# Altium schematic symbol library Connector.SchLib: 394 symbols (part 4 of 4)
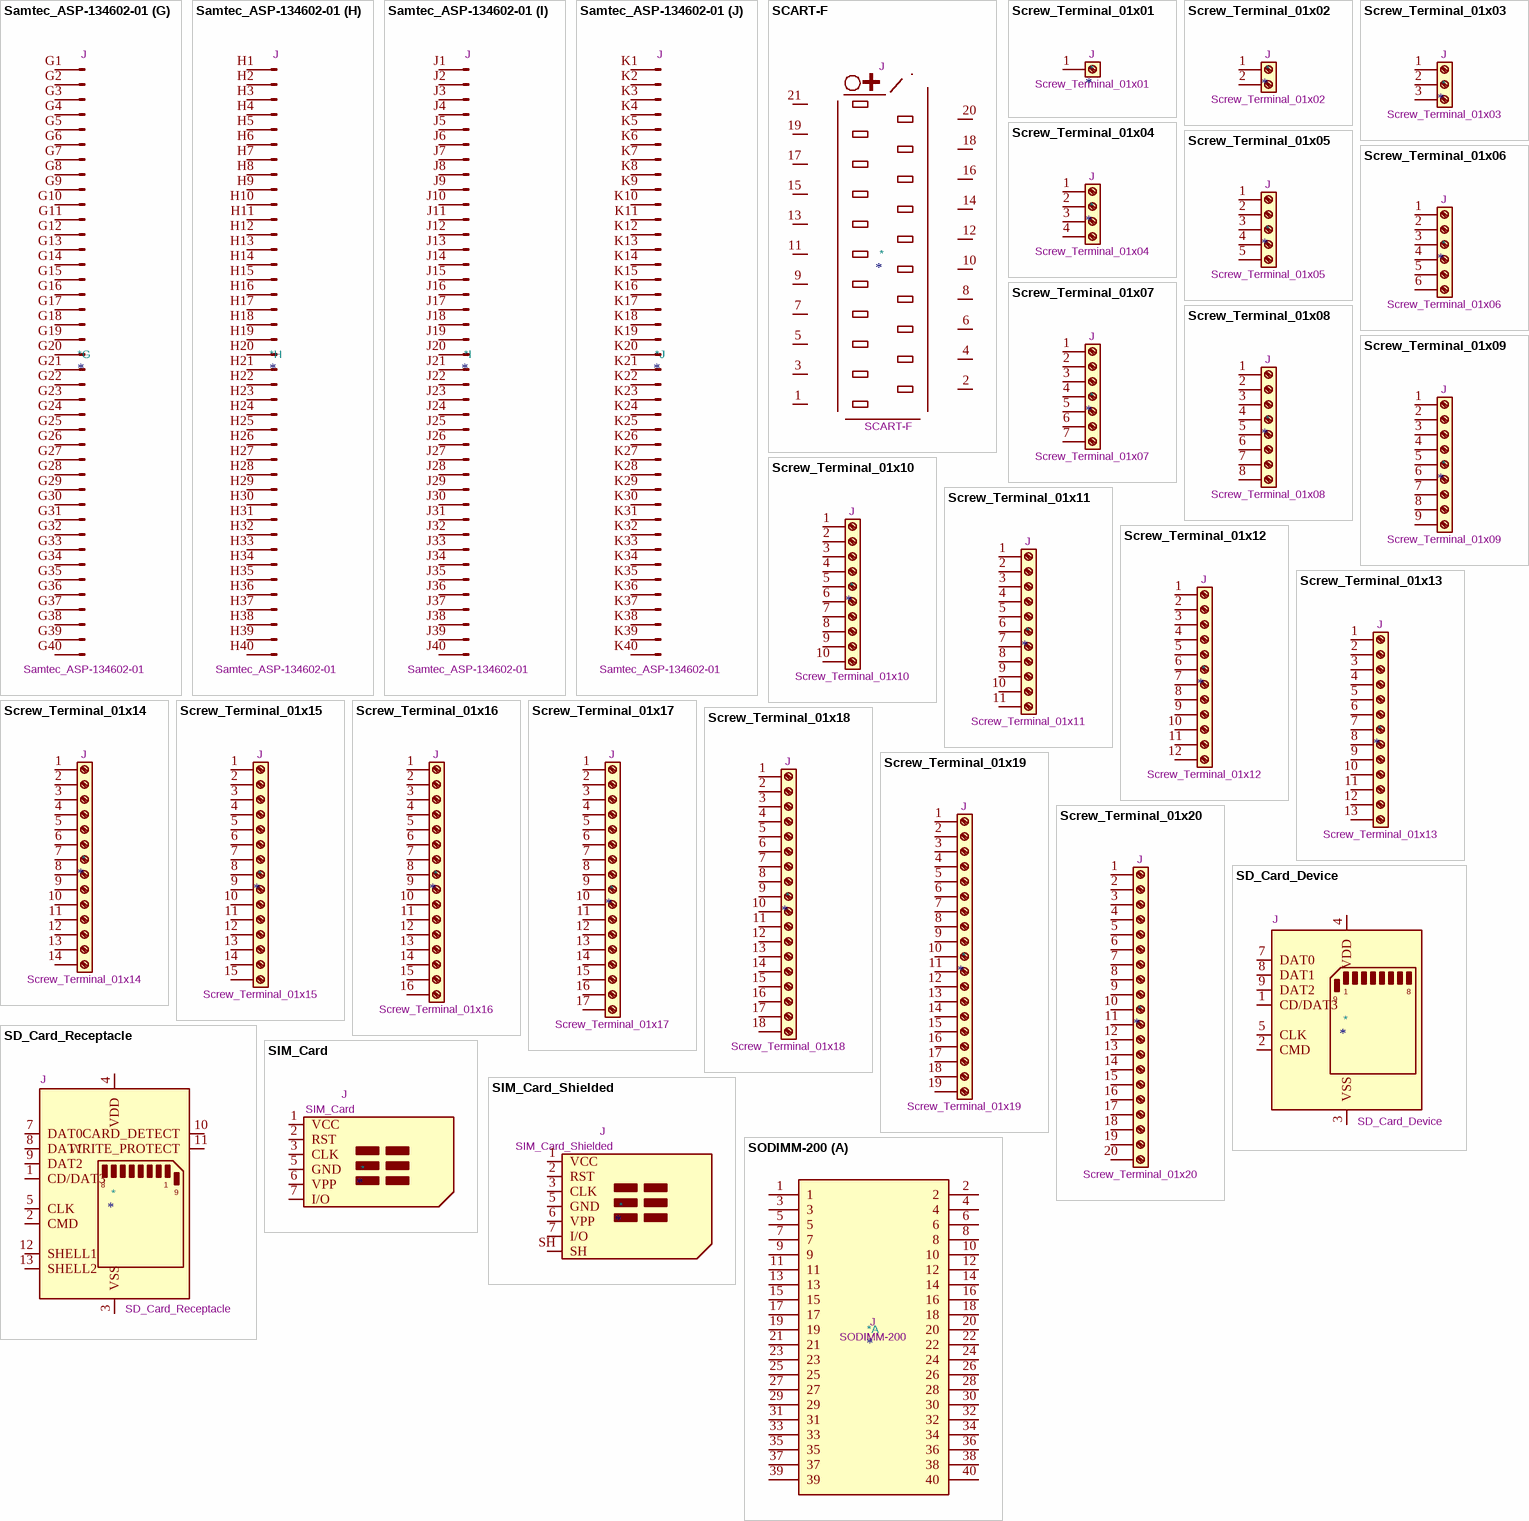
[diagram p20: symbols Samtec_ASP-134602-01 to SODIMM-200]

## Samtec_ASP-134602-01
designator *  value Samtec_ASP-134602-01  Reference: J
Connector array, 10x40, 1.27mm pitch, mezzanine-card, plug, gold finish, VITA 57.1 FMC, SMD; ki_keywords: FPGA Mezzanine Card FMC Terminal Connector Header; ki_fp_filters: *FMC*ASP*134602?01*10x40*P1.27mm* *FMC*ASP*134486?01*10x40*P1.27mm*; Datasheet: http://suddendocs.samtec.com/prints/asp-134602-01-mkt.pdf; Description_: Connector array, 10x40, 1.27mm pitch, mezzanine-card, plug, gold finish, VITA 57.1 FMC, SMD
part A pins: A1 Pin_1, A2 Pin_2, A3 Pin_3, A4 Pin_4, A5 Pin_5, A6 Pin_6, A7 Pin_7, A8 Pin_8, A9 Pin_9, A10 Pin_10, A11 Pin_11, A12 Pin_12, A13 Pin_13, A14 Pin_14, A15 Pin_15, A16 Pin_16, A17 Pin_17, A18 Pin_18, A19 Pin_19, A20 Pin_20, A21 Pin_21, A22 Pin_22, A23 Pin_23, A24 Pin_24, A25 Pin_25, A26 Pin_26, A27 Pin_27, A28 Pin_28, A29 Pin_29, A30 Pin_30, A31 Pin_31, A32 Pin_32, A33 Pin_33, A34 Pin_34, A35 Pin_35, A36 Pin_36, A37 Pin_37, A38 Pin_38, A39 Pin_39, A40 Pin_40
part B pins: B1 Pin_1, B2 Pin_2, B3 Pin_3, B4 Pin_4, B5 Pin_5, B6 Pin_6, B7 Pin_7, B8 Pin_8, B9 Pin_9, B10 Pin_10, B11 Pin_11, B12 Pin_12, B13 Pin_13, B14 Pin_14, B15 Pin_15, B16 Pin_16, B17 Pin_17, B18 Pin_18, B19 Pin_19, B20 Pin_20, B21 Pin_21, B22 Pin_22, B23 Pin_23, B24 Pin_24, B25 Pin_25, B26 Pin_26, B27 Pin_27, B28 Pin_28, B29 Pin_29, B30 Pin_30, B31 Pin_31, B32 Pin_32, B33 Pin_33, B34 Pin_34, B35 Pin_35, B36 Pin_36, B37 Pin_37, B38 Pin_38, B39 Pin_39, B40 Pin_40
part C pins: C1 Pin_1, C2 Pin_2, C3 Pin_3, C4 Pin_4, C5 Pin_5, C6 Pin_6, C7 Pin_7, C8 Pin_8, C9 Pin_9, C10 Pin_10, C11 Pin_11, C12 Pin_12, C13 Pin_13, C14 Pin_14, C15 Pin_15, C16 Pin_16, C17 Pin_17, C18 Pin_18, C19 Pin_19, C20 Pin_20, C21 Pin_21, C22 Pin_22, C23 Pin_23, C24 Pin_24, C25 Pin_25, C26 Pin_26, C27 Pin_27, C28 Pin_28, C29 Pin_29, C30 Pin_30, C31 Pin_31, C32 Pin_32, C33 Pin_33, C34 Pin_34, C35 Pin_35, C36 Pin_36, C37 Pin_37, C38 Pin_38, C39 Pin_39, C40 Pin_40
part D pins: D1 Pin_1, D2 Pin_2, D3 Pin_3, D4 Pin_4, D5 Pin_5, D6 Pin_6, D7 Pin_7, D8 Pin_8, D9 Pin_9, D10 Pin_10, D11 Pin_11, D12 Pin_12, D13 Pin_13, D14 Pin_14, D15 Pin_15, D16 Pin_16, D17 Pin_17, D18 Pin_18, D19 Pin_19, D20 Pin_20, D21 Pin_21, D22 Pin_22, D23 Pin_23, D24 Pin_24, D25 Pin_25, D26 Pin_26, D27 Pin_27, D28 Pin_28, D29 Pin_29, D30 Pin_30, D31 Pin_31, D32 Pin_32, D33 Pin_33, D34 Pin_34, D35 Pin_35, D36 Pin_36, D37 Pin_37, D38 Pin_38, D39 Pin_39, D40 Pin_40
part E pins: E1 Pin_1, E2 Pin_2, E3 Pin_3, E4 Pin_4, E5 Pin_5, E6 Pin_6, E7 Pin_7, E8 Pin_8, E9 Pin_9, E10 Pin_10, E11 Pin_11, E12 Pin_12, E13 Pin_13, E14 Pin_14, E15 Pin_15, E16 Pin_16, E17 Pin_17, E18 Pin_18, E19 Pin_19, E20 Pin_20, E21 Pin_21, E22 Pin_22, E23 Pin_23, E24 Pin_24, E25 Pin_25, E26 Pin_26, E27 Pin_27, E28 Pin_28, E29 Pin_29, E30 Pin_30, E31 Pin_31, E32 Pin_32, E33 Pin_33, E34 Pin_34, E35 Pin_35, E36 Pin_36, E37 Pin_37, E38 Pin_38, E39 Pin_39, E40 Pin_40
part F pins: F1 Pin_1, F2 Pin_2, F3 Pin_3, F4 Pin_4, F5 Pin_5, F6 Pin_6, F7 Pin_7, F8 Pin_8, F9 Pin_9, F10 Pin_10, F11 Pin_11, F12 Pin_12, F13 Pin_13, F14 Pin_14, F15 Pin_15, F16 Pin_16, F17 Pin_17, F18 Pin_18, F19 Pin_19, F20 Pin_20, F21 Pin_21, F22 Pin_22, F23 Pin_23, F24 Pin_24, F25 Pin_25, F26 Pin_26, F27 Pin_27, F28 Pin_28, F29 Pin_29, F30 Pin_30, F31 Pin_31, F32 Pin_32, F33 Pin_33, F34 Pin_34, F35 Pin_35, F36 Pin_36, F37 Pin_37, F38 Pin_38, F39 Pin_39, F40 Pin_40
part G pins: G1 Pin_1, G2 Pin_2, G3 Pin_3, G4 Pin_4, G5 Pin_5, G6 Pin_6, G7 Pin_7, G8 Pin_8, G9 Pin_9, G10 Pin_10, G11 Pin_11, G12 Pin_12, G13 Pin_13, G14 Pin_14, G15 Pin_15, G16 Pin_16, G17 Pin_17, G18 Pin_18, G19 Pin_19, G20 Pin_20, G21 Pin_21, G22 Pin_22, G23 Pin_23, G24 Pin_24, G25 Pin_25, G26 Pin_26, G27 Pin_27, G28 Pin_28, G29 Pin_29, G30 Pin_30, G31 Pin_31, G32 Pin_32, G33 Pin_33, G34 Pin_34, G35 Pin_35, G36 Pin_36, G37 Pin_37, G38 Pin_38, G39 Pin_39, G40 Pin_40
part H pins: H1 Pin_1, H2 Pin_2, H3 Pin_3, H4 Pin_4, H5 Pin_5, H6 Pin_6, H7 Pin_7, H8 Pin_8, H9 Pin_9, H10 Pin_10, H11 Pin_11, H12 Pin_12, H13 Pin_13, H14 Pin_14, H15 Pin_15, H16 Pin_16, H17 Pin_17, H18 Pin_18, H19 Pin_19, H20 Pin_20, H21 Pin_21, H22 Pin_22, H23 Pin_23, H24 Pin_24, H25 Pin_25, H26 Pin_26, H27 Pin_27, H28 Pin_28, H29 Pin_29, H30 Pin_30, H31 Pin_31, H32 Pin_32, H33 Pin_33, H34 Pin_34, H35 Pin_35, H36 Pin_36, H37 Pin_37, H38 Pin_38, H39 Pin_39, H40 Pin_40
part I pins: J1 Pin_1, J2 Pin_2, J3 Pin_3, J4 Pin_4, J5 Pin_5, J6 Pin_6, J7 Pin_7, J8 Pin_8, J9 Pin_9, J10 Pin_10, J11 Pin_11, J12 Pin_12, J13 Pin_13, J14 Pin_14, J15 Pin_15, J16 Pin_16, J17 Pin_17, J18 Pin_18, J19 Pin_19, J20 Pin_20, J21 Pin_21, J22 Pin_22, J23 Pin_23, J24 Pin_24, J25 Pin_25, J26 Pin_26, J27 Pin_27, J28 Pin_28, J29 Pin_29, J30 Pin_30, J31 Pin_31, J32 Pin_32, J33 Pin_33, J34 Pin_34, J35 Pin_35, J36 Pin_36, J37 Pin_37, J38 Pin_38, J39 Pin_39, J40 Pin_40
part J pins: K1 Pin_1, K2 Pin_2, K3 Pin_3, K4 Pin_4, K5 Pin_5, K6 Pin_6, K7 Pin_7, K8 Pin_8, K9 Pin_9, K10 Pin_10, K11 Pin_11, K12 Pin_12, K13 Pin_13, K14 Pin_14, K15 Pin_15, K16 Pin_16, K17 Pin_17, K18 Pin_18, K19 Pin_19, K20 Pin_20, K21 Pin_21, K22 Pin_22, K23 Pin_23, K24 Pin_24, K25 Pin_25, K26 Pin_26, K27 Pin_27, K28 Pin_28, K29 Pin_29, K30 Pin_30, K31 Pin_31, K32 Pin_32, K33 Pin_33, K34 Pin_34, K35 Pin_35, K36 Pin_36, K37 Pin_37, K38 Pin_38, K39 Pin_39, K40 Pin_40

## SCART-F
designator *  value SCART-F  Reference: J
Prise Peritel; ki_keywords: connector; Datasheet: ~; Description_: Prise Peritel
pins: 1 P1, 2 P2, 3 P3, 4 P4, 5 P5, 6 P6, 7 P7, 8 P8, 9 P9, 10 P10, 11 P11, 12 P12, 13 P13, 14 P14, 15 P15, 16 P16, 17 P17, 18 P18, 19 P19, 20 P20, 21 P21
text: +

## Screw_Terminal_01x01
designator *  value Screw_Terminal_01x01  Reference: J
Generic screw terminal, single row, 01x01, script generated (kicad-library-utils/schlib/autogen/connector/); ki_fp_filters: TerminalBlock*:*; Datasheet: ~; Description_: Generic screw terminal, single row, 01x01, script generated (kicad-library-utils/schlib/autogen/connector/); ki_keywords: screw terminal
pins: 1 Pin_1

## Screw_Terminal_01x02
designator *  value Screw_Terminal_01x02  Reference: J
Generic screw terminal, single row, 01x02, script generated (kicad-library-utils/schlib/autogen/connector/); ki_fp_filters: TerminalBlock*:*; Datasheet: ~; Description_: Generic screw terminal, single row, 01x02, script generated (kicad-library-utils/schlib/autogen/connector/); ki_keywords: screw terminal
pins: 1 Pin_1, 2 Pin_2

## Screw_Terminal_01x03
designator *  value Screw_Terminal_01x03  Reference: J
Generic screw terminal, single row, 01x03, script generated (kicad-library-utils/schlib/autogen/connector/); ki_fp_filters: TerminalBlock*:*; Datasheet: ~; Description_: Generic screw terminal, single row, 01x03, script generated (kicad-library-utils/schlib/autogen/connector/); ki_keywords: screw terminal
pins: 1 Pin_1, 2 Pin_2, 3 Pin_3

## Screw_Terminal_01x04
designator *  value Screw_Terminal_01x04  Reference: J
Generic screw terminal, single row, 01x04, script generated (kicad-library-utils/schlib/autogen/connector/); ki_fp_filters: TerminalBlock*:*; Datasheet: ~; Description_: Generic screw terminal, single row, 01x04, script generated (kicad-library-utils/schlib/autogen/connector/); ki_keywords: screw terminal
pins: 1 Pin_1, 2 Pin_2, 3 Pin_3, 4 Pin_4

## Screw_Terminal_01x05
designator *  value Screw_Terminal_01x05  Reference: J
Generic screw terminal, single row, 01x05, script generated (kicad-library-utils/schlib/autogen/connector/); ki_fp_filters: TerminalBlock*:*; Datasheet: ~; Description_: Generic screw terminal, single row, 01x05, script generated (kicad-library-utils/schlib/autogen/connector/); ki_keywords: screw terminal
pins: 1 Pin_1, 2 Pin_2, 3 Pin_3, 4 Pin_4, 5 Pin_5

## Screw_Terminal_01x06
designator *  value Screw_Terminal_01x06  Reference: J
Generic screw terminal, single row, 01x06, script generated (kicad-library-utils/schlib/autogen/connector/); ki_fp_filters: TerminalBlock*:*; Datasheet: ~; Description_: Generic screw terminal, single row, 01x06, script generated (kicad-library-utils/schlib/autogen/connector/); ki_keywords: screw terminal
pins: 1 Pin_1, 2 Pin_2, 3 Pin_3, 4 Pin_4, 5 Pin_5, 6 Pin_6

## Screw_Terminal_01x07
designator *  value Screw_Terminal_01x07  Reference: J
Generic screw terminal, single row, 01x07, script generated (kicad-library-utils/schlib/autogen/connector/); ki_fp_filters: TerminalBlock*:*; Datasheet: ~; Description_: Generic screw terminal, single row, 01x07, script generated (kicad-library-utils/schlib/autogen/connector/); ki_keywords: screw terminal
pins: 1 Pin_1, 2 Pin_2, 3 Pin_3, 4 Pin_4, 5 Pin_5, 6 Pin_6, 7 Pin_7

## Screw_Terminal_01x08
designator *  value Screw_Terminal_01x08  Reference: J
Generic screw terminal, single row, 01x08, script generated (kicad-library-utils/schlib/autogen/connector/); ki_fp_filters: TerminalBlock*:*; Datasheet: ~; Description_: Generic screw terminal, single row, 01x08, script generated (kicad-library-utils/schlib/autogen/connector/); ki_keywords: screw terminal
pins: 1 Pin_1, 2 Pin_2, 3 Pin_3, 4 Pin_4, 5 Pin_5, 6 Pin_6, 7 Pin_7, 8 Pin_8

## Screw_Terminal_01x09
designator *  value Screw_Terminal_01x09  Reference: J
Generic screw terminal, single row, 01x09, script generated (kicad-library-utils/schlib/autogen/connector/); ki_fp_filters: TerminalBlock*:*; Datasheet: ~; Description_: Generic screw terminal, single row, 01x09, script generated (kicad-library-utils/schlib/autogen/connector/); ki_keywords: screw terminal
pins: 1 Pin_1, 2 Pin_2, 3 Pin_3, 4 Pin_4, 5 Pin_5, 6 Pin_6, 7 Pin_7, 8 Pin_8, 9 Pin_9

## Screw_Terminal_01x10
designator *  value Screw_Terminal_01x10  Reference: J
Generic screw terminal, single row, 01x10, script generated (kicad-library-utils/schlib/autogen/connector/); ki_fp_filters: TerminalBlock*:*; Datasheet: ~; Description_: Generic screw terminal, single row, 01x10, script generated (kicad-library-utils/schlib/autogen/connector/); ki_keywords: screw terminal
pins: 1 Pin_1, 2 Pin_2, 3 Pin_3, 4 Pin_4, 5 Pin_5, 6 Pin_6, 7 Pin_7, 8 Pin_8, 9 Pin_9, 10 Pin_10

## Screw_Terminal_01x11
designator *  value Screw_Terminal_01x11  Reference: J
Generic screw terminal, single row, 01x11, script generated (kicad-library-utils/schlib/autogen/connector/); ki_fp_filters: TerminalBlock*:*; Datasheet: ~; Description_: Generic screw terminal, single row, 01x11, script generated (kicad-library-utils/schlib/autogen/connector/); ki_keywords: screw terminal
pins: 1 Pin_1, 2 Pin_2, 3 Pin_3, 4 Pin_4, 5 Pin_5, 6 Pin_6, 7 Pin_7, 8 Pin_8, 9 Pin_9, 10 Pin_10, 11 Pin_11

## Screw_Terminal_01x12
designator *  value Screw_Terminal_01x12  Reference: J
Generic screw terminal, single row, 01x12, script generated (kicad-library-utils/schlib/autogen/connector/); ki_fp_filters: TerminalBlock*:*; Datasheet: ~; Description_: Generic screw terminal, single row, 01x12, script generated (kicad-library-utils/schlib/autogen/connector/); ki_keywords: screw terminal
pins: 1 Pin_1, 2 Pin_2, 3 Pin_3, 4 Pin_4, 5 Pin_5, 6 Pin_6, 7 Pin_7, 8 Pin_8, 9 Pin_9, 10 Pin_10, 11 Pin_11, 12 Pin_12

## Screw_Terminal_01x13
designator *  value Screw_Terminal_01x13  Reference: J
Generic screw terminal, single row, 01x13, script generated (kicad-library-utils/schlib/autogen/connector/); ki_fp_filters: TerminalBlock*:*; Datasheet: ~; Description_: Generic screw terminal, single row, 01x13, script generated (kicad-library-utils/schlib/autogen/connector/); ki_keywords: screw terminal
pins: 1 Pin_1, 2 Pin_2, 3 Pin_3, 4 Pin_4, 5 Pin_5, 6 Pin_6, 7 Pin_7, 8 Pin_8, 9 Pin_9, 10 Pin_10, 11 Pin_11, 12 Pin_12, 13 Pin_13

## Screw_Terminal_01x14
designator *  value Screw_Terminal_01x14  Reference: J
Generic screw terminal, single row, 01x14, script generated (kicad-library-utils/schlib/autogen/connector/); ki_fp_filters: TerminalBlock*:*; Datasheet: ~; Description_: Generic screw terminal, single row, 01x14, script generated (kicad-library-utils/schlib/autogen/connector/); ki_keywords: screw terminal
pins: 1 Pin_1, 2 Pin_2, 3 Pin_3, 4 Pin_4, 5 Pin_5, 6 Pin_6, 7 Pin_7, 8 Pin_8, 9 Pin_9, 10 Pin_10, 11 Pin_11, 12 Pin_12, 13 Pin_13, 14 Pin_14

## Screw_Terminal_01x15
designator *  value Screw_Terminal_01x15  Reference: J
Generic screw terminal, single row, 01x15, script generated (kicad-library-utils/schlib/autogen/connector/); ki_fp_filters: TerminalBlock*:*; Datasheet: ~; Description_: Generic screw terminal, single row, 01x15, script generated (kicad-library-utils/schlib/autogen/connector/); ki_keywords: screw terminal
pins: 1 Pin_1, 2 Pin_2, 3 Pin_3, 4 Pin_4, 5 Pin_5, 6 Pin_6, 7 Pin_7, 8 Pin_8, 9 Pin_9, 10 Pin_10, 11 Pin_11, 12 Pin_12, 13 Pin_13, 14 Pin_14, 15 Pin_15

## Screw_Terminal_01x16
designator *  value Screw_Terminal_01x16  Reference: J
Generic screw terminal, single row, 01x16, script generated (kicad-library-utils/schlib/autogen/connector/); ki_fp_filters: TerminalBlock*:*; Datasheet: ~; Description_: Generic screw terminal, single row, 01x16, script generated (kicad-library-utils/schlib/autogen/connector/); ki_keywords: screw terminal
pins: 1 Pin_1, 2 Pin_2, 3 Pin_3, 4 Pin_4, 5 Pin_5, 6 Pin_6, 7 Pin_7, 8 Pin_8, 9 Pin_9, 10 Pin_10, 11 Pin_11, 12 Pin_12, 13 Pin_13, 14 Pin_14, 15 Pin_15, 16 Pin_16

## Screw_Terminal_01x17
designator *  value Screw_Terminal_01x17  Reference: J
Generic screw terminal, single row, 01x17, script generated (kicad-library-utils/schlib/autogen/connector/); ki_fp_filters: TerminalBlock*:*; Datasheet: ~; Description_: Generic screw terminal, single row, 01x17, script generated (kicad-library-utils/schlib/autogen/connector/); ki_keywords: screw terminal
pins: 1 Pin_1, 2 Pin_2, 3 Pin_3, 4 Pin_4, 5 Pin_5, 6 Pin_6, 7 Pin_7, 8 Pin_8, 9 Pin_9, 10 Pin_10, 11 Pin_11, 12 Pin_12, 13 Pin_13, 14 Pin_14, 15 Pin_15, 16 Pin_16, 17 Pin_17

## Screw_Terminal_01x18
designator *  value Screw_Terminal_01x18  Reference: J
Generic screw terminal, single row, 01x18, script generated (kicad-library-utils/schlib/autogen/connector/); ki_fp_filters: TerminalBlock*:*; Datasheet: ~; Description_: Generic screw terminal, single row, 01x18, script generated (kicad-library-utils/schlib/autogen/connector/); ki_keywords: screw terminal
pins: 1 Pin_1, 2 Pin_2, 3 Pin_3, 4 Pin_4, 5 Pin_5, 6 Pin_6, 7 Pin_7, 8 Pin_8, 9 Pin_9, 10 Pin_10, 11 Pin_11, 12 Pin_12, 13 Pin_13, 14 Pin_14, 15 Pin_15, 16 Pin_16, 17 Pin_17, 18 Pin_18

## Screw_Terminal_01x19
designator *  value Screw_Terminal_01x19  Reference: J
Generic screw terminal, single row, 01x19, script generated (kicad-library-utils/schlib/autogen/connector/); ki_fp_filters: TerminalBlock*:*; Datasheet: ~; Description_: Generic screw terminal, single row, 01x19, script generated (kicad-library-utils/schlib/autogen/connector/); ki_keywords: screw terminal
pins: 1 Pin_1, 2 Pin_2, 3 Pin_3, 4 Pin_4, 5 Pin_5, 6 Pin_6, 7 Pin_7, 8 Pin_8, 9 Pin_9, 10 Pin_10, 11 Pin_11, 12 Pin_12, 13 Pin_13, 14 Pin_14, 15 Pin_15, 16 Pin_16, 17 Pin_17, 18 Pin_18, 19 Pin_19

## Screw_Terminal_01x20
designator *  value Screw_Terminal_01x20  Reference: J
Generic screw terminal, single row, 01x20, script generated (kicad-library-utils/schlib/autogen/connector/); ki_fp_filters: TerminalBlock*:*; Datasheet: ~; Description_: Generic screw terminal, single row, 01x20, script generated (kicad-library-utils/schlib/autogen/connector/); ki_keywords: screw terminal
pins: 1 Pin_1, 2 Pin_2, 3 Pin_3, 4 Pin_4, 5 Pin_5, 6 Pin_6, 7 Pin_7, 8 Pin_8, 9 Pin_9, 10 Pin_10, 11 Pin_11, 12 Pin_12, 13 Pin_13, 14 Pin_14, 15 Pin_15, 16 Pin_16, 17 Pin_17, 18 Pin_18, 19 Pin_19, 20 Pin_20

## SD_Card_Device
designator *  value SD_Card_Device  Reference: J
SD card device/card; ki_keywords: connector SD; ki_fp_filters: SD*Device*; Datasheet: http://www.convict.lu/pdf/ProdManualSDCardv1.9.pdf; Description_: SD card device/card
pins: 1 CD/DAT3, 2 CMD, 3 VSS, 4 VDD, 5 CLK, 6 VSS hidden, 7 DAT0, 8 DAT1, 9 DAT2

## SD_Card_Receptacle
designator *  value SD_Card_Receptacle  Reference: J
SD card receptacle; ki_keywords: connector SD; ki_fp_filters: SD*; Datasheet: http://portal.fciconnect.com/Comergent//fci/drawing/10067847.pdf; Description_: SD card receptacle
pins: 1 CD/DAT3, 2 CMD, 3 VSS, 4 VDD, 5 CLK, 6 VSS hidden, 7 DAT0, 8 DAT1, 9 DAT2, 10 CARD_DETECT, 11 WRITE_PROTECT, 12 SHELL1, 13 SHELL2

## SIM_Card
designator *  value SIM_Card  Reference: J
SIM Card; ki_keywords: SIM card UICC; ki_fp_filters: *SIM*Card*Holder*; Datasheet: ~; Description_: SIM Card
pins: 1 VCC, 2 RST, 3 CLK, 5 GND, 6 VPP, 7 I/O

## SIM_Card_Shielded
designator *  value SIM_Card_Shielded  Reference: J
SIM Card; ki_keywords: SIM card UICC; ki_fp_filters: *SIM*Card*Holder*; Datasheet: ~; Description_: SIM Card
pins: 1 VCC, 2 RST, 3 CLK, 5 GND, 6 VPP, 7 I/O, SH

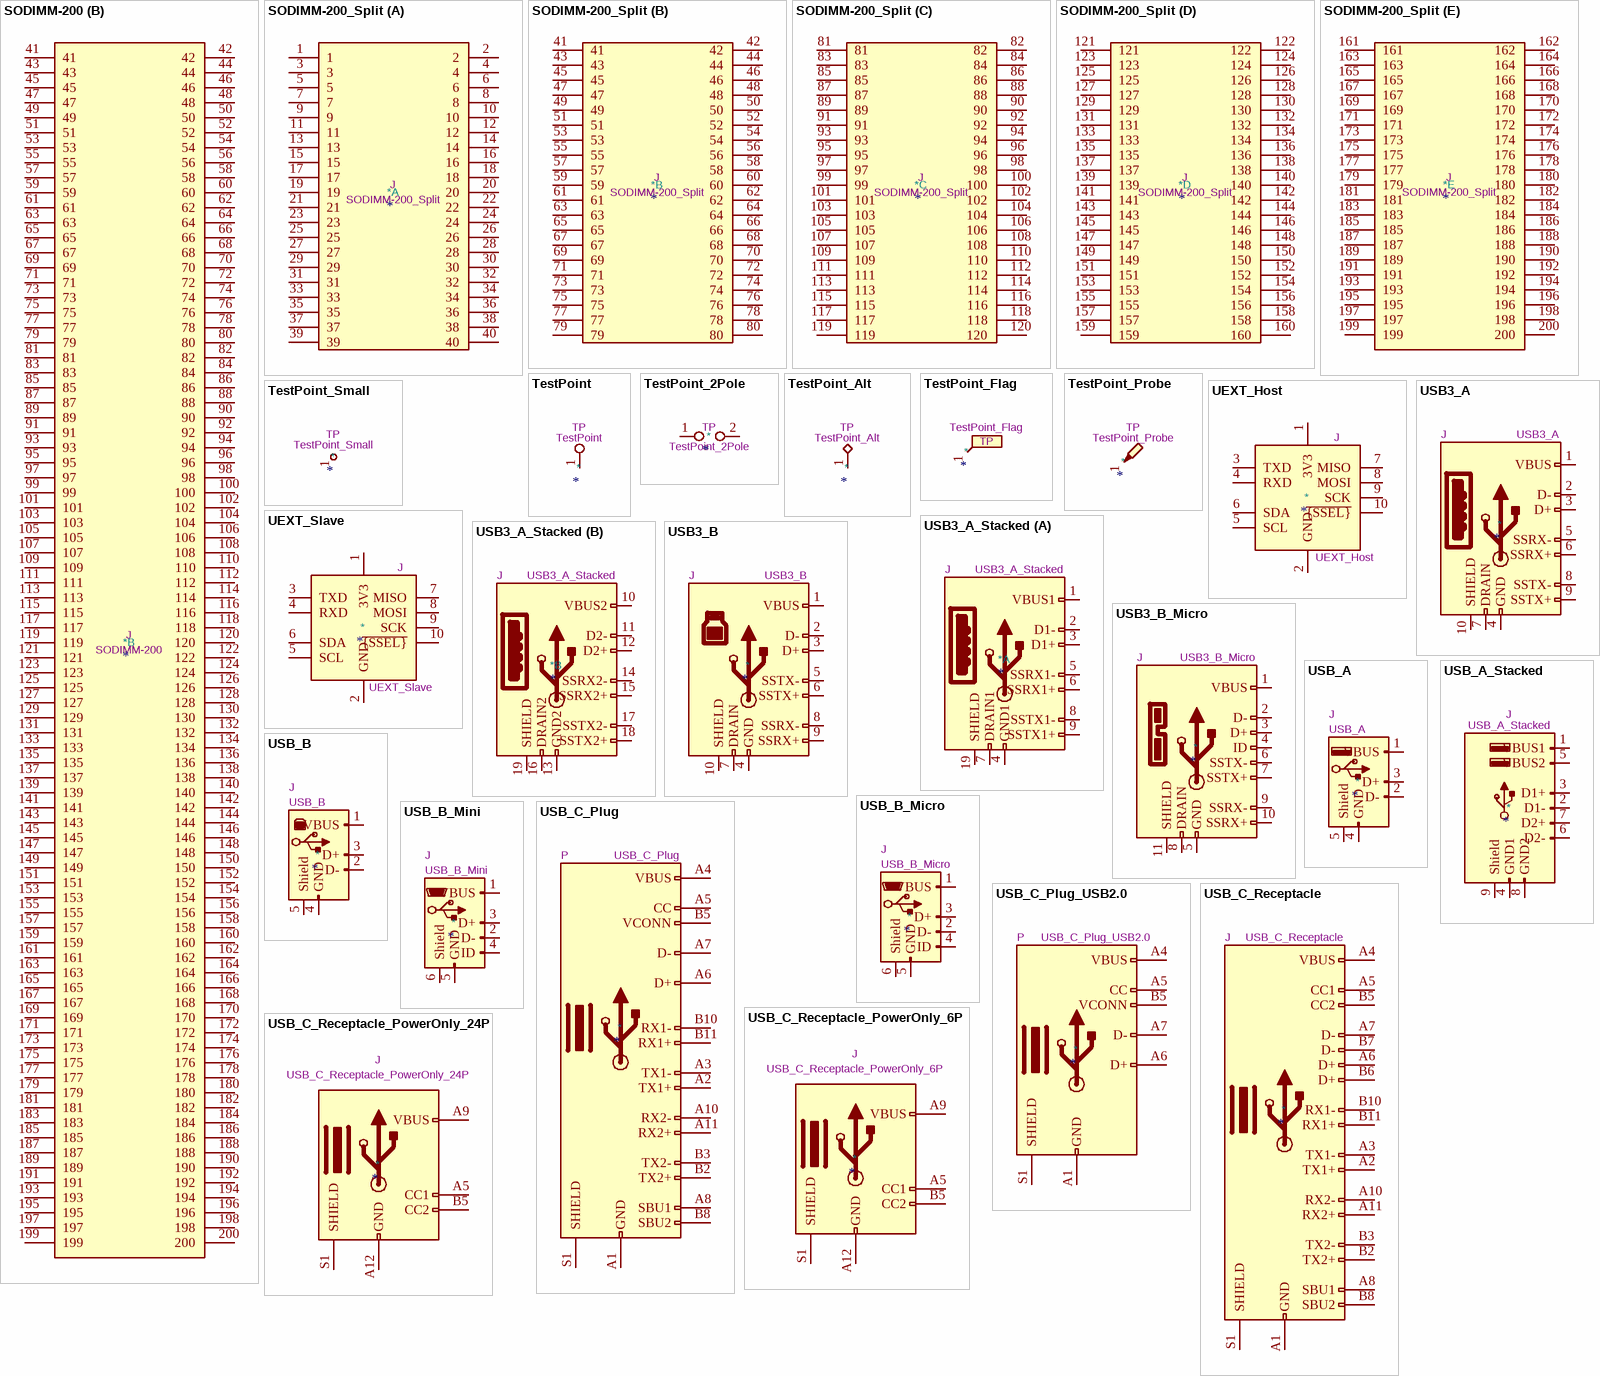
[diagram p16: symbols SODIMM-200 to USB_C_Receptacle_PowerOnly_24P]

## SODIMM-200
designator *  value SODIMM-200  Reference: J
SODIMM 200 Pin socket; ki_keywords: SODIMM SO-DIMM DDR1 DDR2; ki_fp_filters: *SODIMM*; Datasheet: ~; Description_: SODIMM 200 Pin socket
part A pins: 1, 2, 3, 4, 5, 6, 7, 8, 9, 10, 11, 12, 13, 14, 15, 16, 17, 18, 19, 20, 21, 22, 23, 24, 25, 26, 27, 28, 29, 30, 31, 32, 33, 34, 35, 36, 37, 38, 39, 40
part B pins: 41, 42, 43, 44, 45, 46, 47, 48, 49, 50, 51, 52, 53, 54, 55, 56, 57, 58, 59, 60, 61, 62, 63, 64, 65, 66, 67, 68, 69, 70, 71, 72, 73, 74, 75, 76, 77, 78, 79, 80, 81, 82, 83, 84, 85, 86, 87, 88, 89, 90, 91, 92, 93, 94, 95, 96, 97, 98, 99, 100, 101, 102, 103, 104, 105, 106, 107, 108, 109, 110, 111, 112, 113, 114, 115, 116, 117, 118, 119, 120, 121, 122, 123, 124, 125, 126, 127, 128, 129, 130, 131, 132, 133, 134, 135, 136, 137, 138, 139, 140, 141, 142, 143, 144, 145, 146, 147, 148, 149, 150, 151, 152, 153, 154, 155, 156, 157, 158, 159, 160, 161, 162, 163, 164, 165, 166, 167, 168, 169, 170, 171, 172, 173, 174, 175, 176, 177, 178, 179, 180, 181, 182, 183, 184, 185, 186, 187, 188, 189, 190, 191, 192, 193, 194, 195, 196, 197, 198, 199, 200

## SODIMM-200_Split
designator *  value SODIMM-200_Split  Reference: J
SODIMM 200 Pin socket; ki_keywords: SODIMM SO-DIMM DDR1 DDR2; ki_fp_filters: *SODIMM*; Datasheet: ~; Description_: SODIMM 200 Pin socket
part A pins: 1, 2, 3, 4, 5, 6, 7, 8, 9, 10, 11, 12, 13, 14, 15, 16, 17, 18, 19, 20, 21, 22, 23, 24, 25, 26, 27, 28, 29, 30, 31, 32, 33, 34, 35, 36, 37, 38, 39, 40
part B pins: 41, 42, 43, 44, 45, 46, 47, 48, 49, 50, 51, 52, 53, 54, 55, 56, 57, 58, 59, 60, 61, 62, 63, 64, 65, 66, 67, 68, 69, 70, 71, 72, 73, 74, 75, 76, 77, 78, 79, 80
part C pins: 81, 82, 83, 84, 85, 86, 87, 88, 89, 90, 91, 92, 93, 94, 95, 96, 97, 98, 99, 100, 101, 102, 103, 104, 105, 106, 107, 108, 109, 110, 111, 112, 113, 114, 115, 116, 117, 118, 119, 120
part D pins: 121, 122, 123, 124, 125, 126, 127, 128, 129, 130, 131, 132, 133, 134, 135, 136, 137, 138, 139, 140, 141, 142, 143, 144, 145, 146, 147, 148, 149, 150, 151, 152, 153, 154, 155, 156, 157, 158, 159, 160
part E pins: 161, 162, 163, 164, 165, 166, 167, 168, 169, 170, 171, 172, 173, 174, 175, 176, 177, 178, 179, 180, 181, 182, 183, 184, 185, 186, 187, 188, 189, 190, 191, 192, 193, 194, 195, 196, 197, 198, 199, 200

## TestPoint
designator *  value TestPoint  Reference: TP
test point; ki_keywords: test point tp; ki_fp_filters: Pin* Test*; Datasheet: ~; Description_: test point
pins: 1

## TestPoint_2Pole
designator *  value TestPoint_2Pole  Reference: TP
2-polar test point; ki_keywords: point tp; ki_fp_filters: Pin* Test*; Datasheet: ~; Description_: 2-polar test point
pins: 1, 2

## TestPoint_Alt
designator *  value TestPoint_Alt  Reference: TP
test point (alternative shape); ki_keywords: test point tp; ki_fp_filters: Pin* Test*; Datasheet: ~; Description_: test point (alternative shape)
pins: 1

## TestPoint_Flag
designator *  value TestPoint_Flag  Reference: TP
test point (alternative flag-style design); ki_keywords: test point tp; ki_fp_filters: Pin* Test*; Datasheet: ~; Description_: test point (alternative flag-style design)
pins: 1

## TestPoint_Probe
designator *  value TestPoint_Probe  Reference: TP
test point (alternative probe-style design); ki_keywords: test point tp; ki_fp_filters: Pin* Test*; Datasheet: ~; Description_: test point (alternative probe-style design)
pins: 1

## TestPoint_Small
designator *  value TestPoint_Small  Reference: TP
test point; ki_keywords: test point tp; ki_fp_filters: Pin* Test*; Datasheet: ~; Description_: test point
pins: 1

## UEXT_Host
designator *  value UEXT_Host  Reference: J
Universal EXTension (UEXT) is a connector layout which includes power and three serial buses: Asynchronous, I2C, and SPI; ki_keywords: UEXT, SPI, UART, I2C; ki_fp_filters: *Connector*:2x05*; Datasheet: https://www.olimex.com/Products/Modules/UEXT/resources/UEXT_rev_B.pdf; Description_: Universal EXTension (UEXT) is a connector layout which includes power and three serial buses: Asynchronous, I2C, and SPI
pins: 1 3V3, 2 GND, 3 TXD, 4 RXD, 5 SCL, 6 SDA, 7 MISO, 8 MOSI, 9 SCK, 10 ~{{SSEL}}

## UEXT_Slave
designator *  value UEXT_Slave  Reference: J
Universal EXTension (UEXT) is a connector layout which includes power and three serial buses: Asynchronous, I2C, and SPI; ki_keywords: UEXT, SPI, UART, I2C; ki_fp_filters: *Connector*:2x05*; Datasheet: https://www.olimex.com/Products/Modules/UEXT/resources/UEXT_rev_B.pdf; Description_: Universal EXTension (UEXT) is a connector layout which includes power and three serial buses: Asynchronous, I2C, and SPI
pins: 1 3V3, 2 GND, 3 TXD, 4 RXD, 5 SCL, 6 SDA, 7 MISO, 8 MOSI, 9 SCK, 10 ~{{SSEL}}

## USB3_A
designator *  value USB3_A  Reference: J
USB 3.0 A connector; ki_keywords: usb universal serial bus; ki_fp_filters: USB3*; Datasheet: ~; Description_: USB 3.0 A connector
pins: 1 VBUS, 2 D-, 3 D+, 4 GND, 5 SSRX-, 6 SSRX+, 7 DRAIN, 8 SSTX-, 9 SSTX+, 10 SHIELD

## USB3_A_Stacked
designator *  value USB3_A_Stacked  Reference: J
USB 3.0 A connector, stacked; ki_keywords: usb universal serial bus; ki_fp_filters: USB3?A*Stacked*; Datasheet: ~; Description_: USB 3.0 A connector, stacked
part A pins: 1 VBUS1, 2 D1-, 3 D1+, 4 GND1, 5 SSRX1-, 6 SSRX1+, 7 DRAIN1, 8 SSTX1-, 9 SSTX1+, 19 SHIELD
part B pins: 10 VBUS2, 11 D2-, 12 D2+, 13 GND2, 14 SSRX2-, 15 SSRX2+, 16 DRAIN2, 17 SSTX2-, 18 SSTX2+, 19 SHIELD

## USB3_B
designator *  value USB3_B  Reference: J
USB 3.0 B connector; ki_keywords: usb universal serial bus; Datasheet: ~; Description_: USB 3.0 B connector
pins: 1 VBUS, 2 D-, 3 D+, 4 GND, 5 SSTX-, 6 SSTX+, 7 DRAIN, 8 SSRX-, 9 SSRX+, 10 SHIELD

## USB3_B_Micro
designator *  value USB3_B_Micro  Reference: J
USB 3.0 Micro-B connector; ki_keywords: usb universal serial bus; Datasheet: ~; Description_: USB 3.0 Micro-B connector
pins: 1 VBUS, 2 D-, 3 D+, 4 ID, 5 GND, 6 SSTX-, 7 SSTX+, 8 DRAIN, 9 SSRX-, 10 SSRX+, 11 SHIELD

## USB_A
designator *  value USB_A  Reference: J
USB Type A connector; ki_keywords: connector USB; ki_fp_filters: USB*; Datasheet: ~; Description_: USB Type A connector
pins: 1 VBUS, 2 D-, 3 D+, 4 GND, 5 Shield

## USB_A_Stacked
designator *  value USB_A_Stacked  Reference: J
USB Type A connector, stacked; ki_keywords: connector USB; ki_fp_filters: USB*; Datasheet: ~; Description_: USB Type A connector, stacked
pins: 1 VBUS1, 2 D1-, 3 D1+, 4 GND1, 5 VBUS2, 6 D2-, 7 D2+, 8 GND2, 9 Shield

## USB_B
designator *  value USB_B  Reference: J
USB Type B connector; ki_keywords: connector USB; ki_fp_filters: USB*; Datasheet: ~; Description_: USB Type B connector
pins: 1 VBUS, 2 D-, 3 D+, 4 GND, 5 Shield

## USB_B_Micro
designator *  value USB_B_Micro  Reference: J
USB Micro Type B connector; ki_keywords: connector USB micro; ki_fp_filters: USB*; Datasheet: ~; Description_: USB Micro Type B connector
pins: 1 VBUS, 2 D-, 3 D+, 4 ID, 5 GND, 6 Shield

## USB_B_Mini
designator *  value USB_B_Mini  Reference: J
USB Mini Type B connector; ki_keywords: connector USB mini; ki_fp_filters: USB*; Datasheet: ~; Description_: USB Mini Type B connector
pins: 1 VBUS, 2 D-, 3 D+, 4 ID, 5 GND, 6 Shield

## USB_C_Plug
designator *  value USB_C_Plug  Reference: P
USB Type-C Plug connector; ki_keywords: usb universal serial bus; ki_fp_filters: USB*C*Plug*; Datasheet: https://www.usb.org/sites/default/files/documents/usb_type-c.zip; Description_: USB Type-C Plug connector
pins: A1 GND, A2 TX1+, A3 TX1-, A4 VBUS, A5 CC, A6 D+, A7 D-, A8 SBU1, A9 VBUS hidden, A10 RX2-, A11 RX2+, A12 GND hidden, B1 GND hidden, B2 TX2+, B3 TX2-, B4 VBUS hidden, B5 VCONN, B8 SBU2, B9 VBUS hidden, B10 RX1-, B11 RX1+, B12 GND hidden, S1 SHIELD

## USB_C_Plug_USB2.0
designator *  value USB_C_Plug_USB2.0  Reference: P
USB 2.0-only Type-C Plug connector; ki_keywords: usb universal serial bus type-C USB2.0; ki_fp_filters: USB*C*Plug*; Datasheet: https://www.usb.org/sites/default/files/documents/usb_type-c.zip; Description_: USB 2.0-only Type-C Plug connector
pins: A1 GND, A4 VBUS, A5 CC, A6 D+, A7 D-, A9 VBUS hidden, A12 GND hidden, B1 GND hidden, B4 VBUS hidden, B5 VCONN, B9 VBUS hidden, B12 GND hidden, S1 SHIELD

## USB_C_Receptacle
designator *  value USB_C_Receptacle  Reference: J
USB Full-Featured Type-C Receptacle connector; ki_keywords: usb universal serial bus type-C full-featured; ki_fp_filters: USB*C*Receptacle*; Datasheet: https://www.usb.org/sites/default/files/documents/usb_type-c.zip; Description_: USB Full-Featured Type-C Receptacle connector
pins: A1 GND, A2 TX1+, A3 TX1-, A4 VBUS, A5 CC1, A6 D+, A7 D-, A8 SBU1, A9 VBUS hidden, A10 RX2-, A11 RX2+, A12 GND hidden, B1 GND hidden, B2 TX2+, B3 TX2-, B4 VBUS hidden, B5 CC2, B6 D+, B7 D-, B8 SBU2, B9 VBUS hidden, B10 RX1-, B11 RX1+, B12 GND hidden, S1 SHIELD

## USB_C_Receptacle_PowerOnly_6P
designator *  value USB_C_Receptacle_PowerOnly_6P  Reference: J
USB Power-Only 6P Type-C Receptacle connector; ki_keywords: usb universal serial bus type-C power-only charging-only 6P 6C; ki_fp_filters: USB*C*Receptacle*; Datasheet: https://www.usb.org/sites/default/files/documents/usb_type-c.zip; Description_: USB Power-Only 6P Type-C Receptacle connector
pins: A5 CC1, A9 VBUS, A12 GND, B5 CC2, B9 VBUS hidden, B12 GND hidden, S1 SHIELD

## USB_C_Receptacle_PowerOnly_24P
designator *  value USB_C_Receptacle_PowerOnly_24P  Reference: J
USB Power-Only 24P Type-C Receptacle connector; ki_keywords: usb universal serial bus type-C power-only charging-only 24P 24C; ki_fp_filters: USB*C*Receptacle*; Datasheet: https://www.usb.org/sites/default/files/documents/usb_type-c.zip; Description_: USB Power-Only 24P Type-C Receptacle connector
pins: A1 GND hidden, A4 VBUS hidden, A5 CC1, A9 VBUS, A12 GND, B1 GND hidden, B4 VBUS hidden, B5 CC2, B9 VBUS hidden, B12 GND hidden, S1 SHIELD

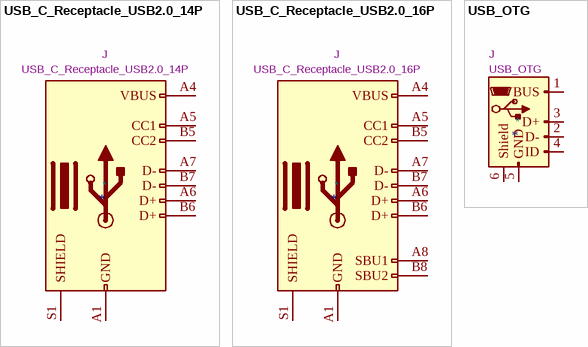
[diagram p17: symbols USB_C_Receptacle_USB2.0_14P to USB_OTG]

## USB_C_Receptacle_USB2.0_14P
designator *  value USB_C_Receptacle_USB2.0_14P  Reference: J
USB 2.0-only 14P Type-C Receptacle connector; ki_keywords: usb universal serial bus type-C USB2.0; ki_fp_filters: USB*C*Receptacle*; Datasheet: https://www.usb.org/sites/default/files/documents/usb_type-c.zip; Description_: USB 2.0-only 14P Type-C Receptacle connector
pins: A1 GND, A4 VBUS, A5 CC1, A6 D+, A7 D-, A9 VBUS hidden, A12 GND hidden, B1 GND hidden, B4 VBUS hidden, B5 CC2, B6 D+, B7 D-, B9 VBUS hidden, B12 GND hidden, S1 SHIELD

## USB_C_Receptacle_USB2.0_16P
designator *  value USB_C_Receptacle_USB2.0_16P  Reference: J
USB 2.0-only 16P Type-C Receptacle connector; ki_keywords: usb universal serial bus type-C USB2.0; ki_fp_filters: USB*C*Receptacle*; Datasheet: https://www.usb.org/sites/default/files/documents/usb_type-c.zip; Description_: USB 2.0-only 16P Type-C Receptacle connector
pins: A1 GND, A4 VBUS, A5 CC1, A6 D+, A7 D-, A8 SBU1, A9 VBUS hidden, A12 GND hidden, B1 GND hidden, B4 VBUS hidden, B5 CC2, B6 D+, B7 D-, B8 SBU2, B9 VBUS hidden, B12 GND hidden, S1 SHIELD

## USB_OTG
designator *  value USB_OTG  Reference: J
USB mini/micro connector; ki_keywords: connector USB; ki_fp_filters: USB*; Datasheet: ~; Description_: USB mini/micro connector
pins: 1 VBUS, 2 D-, 3 D+, 4 ID, 5 GND, 6 Shield